# Altium footprint library 00.PcbLib: 150 footprints (part 7 of 10)
Each footprint in its own frame and in the unit in brackets; x right, y up, seen from the top. Pads: shape width x height; smd on the part's side, far side on the other; paste and mask are expansions set on the pad; w line width, h text height; cw(c..) or ccw(c..) is an arc to the next point about the centre after c.
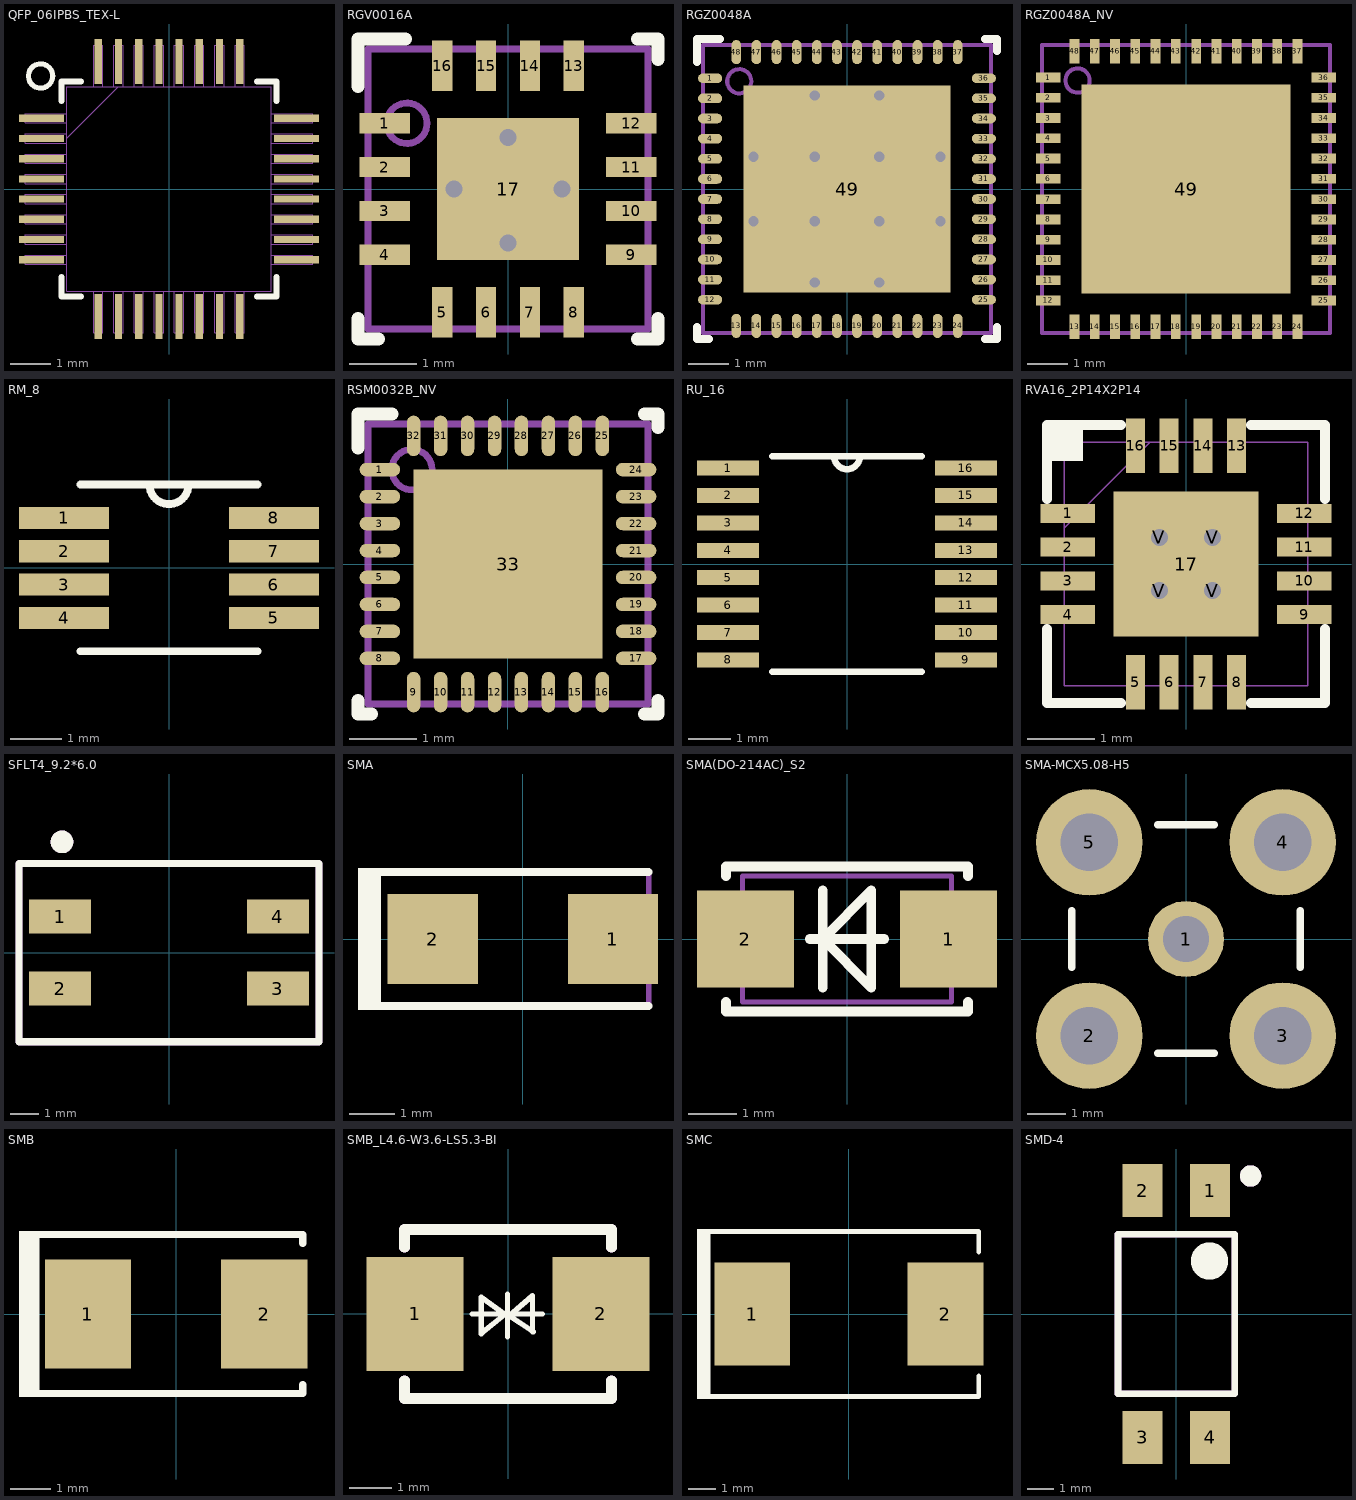
[diagram p6: the footprints below, top view; thin cyan lines are the x and y axes]

## QFP_06IPBS_TEX-L [mil]
pads (32):
  rect 44x7 smd paste+0 mask+0: 1(-124,68.92) 2(-124,49.23) 3(-124,29.54) 4(-124,9.85) 5(-124,-9.85) 6(-124,-29.54) 7(-124,-49.23) 8(-124,-68.92) 17(124,-68.92) 18(124,-49.23) 19(124,-29.54) 20(124,-9.85) 21(124,9.85) 22(124,29.54) 23(124,49.23) 24(124,68.92)
  rect 7x44 smd paste+0 mask+0: 9(-68.92,-124) 10(-49.23,-124) 11(-29.54,-124) 12(-9.85,-124) 13(9.85,-124) 14(29.54,-124) 15(49.23,-124) 16(68.92,-124) 25(68.92,124) 26(49.23,124) 27(29.54,124) 28(9.85,124) 29(-9.85,124) 30(-29.54,124) 31(-49.23,124) 32(-68.92,124)
Top Overlay:
  circle w5: c-125,110 r11.81
  lines w6: -104.5,-85.52 -104.5,-104.5 -85.52,-104.5 ; -104.5,85.52 -104.5,104.5 -85.52,104.5 ; 85.52,-104.5 104.5,-104.5 104.5,-85.52 ; 85.52,104.5 104.5,104.5 104.5,85.52
Top Component Outline (Mech100):
  lines w1: -99.5,49.5 -49.5,99.5 ; -140,-73.42 -99.5,-73.42 -99.5,-64.42 -140,-64.42 -140,-73.42 ; -140,-53.73 -99.5,-53.73 -99.5,-44.73 -140,-44.73 -140,-53.73 ; -140,-34.03 -99.5,-34.03 -99.5,-25.04 -140,-25.04 -140,-34.03 ; -140,-14.35 -99.5,-14.35 -99.5,-5.34 -140,-5.34 -140,-14.35 ; -140,5.34 -99.5,5.34 -99.5,14.35 -140,14.35 -140,5.34 ; -140,25.04 -99.5,25.04 -99.5,34.03 -140,34.03 -140,25.04 ; -140,44.73 -99.5,44.73 -99.5,53.73 -140,53.73 -140,44.73 ; -140,64.42 -99.5,64.42 -99.5,73.42 -140,73.42 -140,64.42 ; -99.5,-99.5 -99.5,99.5 99.5,99.5 99.5,-99.5 -99.5,-99.5 ; -73.42,-140 -64.42,-140 -64.42,-99.5 -73.42,-99.5 -73.42,-140 ; -73.42,99.5 -73.42,140 -64.42,140 -64.42,99.5 -73.42,99.5 ; -53.73,-140 -44.73,-140 -44.73,-99.5 -53.73,-99.5 -53.73,-140 ; -53.73,99.5 -53.73,140 -44.73,140 -44.73,99.5 -53.73,99.5 ; -34.03,-140 -25.04,-140 -25.04,-99.5 -34.03,-99.5 -34.03,-140 ; -34.03,99.5 -34.03,140 -25.04,140 -25.04,99.5 -34.03,99.5 ; -14.35,-140 -5.34,-140 -5.34,-99.5 -14.35,-99.5 -14.35,-140 ; -14.35,99.5 -14.35,140 -5.34,140 -5.34,99.5 -14.35,99.5 ; 5.34,-140 14.35,-140 14.35,-99.5 5.34,-99.5 5.34,-140 ; 5.34,99.5 5.34,140 14.35,140 14.35,99.5 5.34,99.5 ; 25.04,-140 34.03,-140 34.03,-99.5 25.04,-99.5 25.04,-140 ; 25.04,99.5 25.04,140 34.03,140 34.03,99.5 25.04,99.5 ; 44.73,-140 53.73,-140 53.73,-99.5 44.73,-99.5 44.73,-140 ; 44.73,99.5 44.73,140 53.73,140 53.73,99.5 44.73,99.5 ; 64.42,-140 73.42,-140 73.42,-99.5 64.42,-99.5 64.42,-140 ; 64.42,99.5 64.42,140 73.42,140 73.42,99.5 64.42,99.5 ; 99.5,-73.42 140,-73.42 140,-64.42 99.5,-64.42 99.5,-73.42 ; 99.5,-53.73 140,-53.73 140,-44.73 99.5,-44.73 99.5,-53.73 ; 99.5,-34.03 140,-34.03 140,-25.04 99.5,-25.04 99.5,-34.03 ; 99.5,-14.35 140,-14.35 140,-5.34 99.5,-5.34 99.5,-14.35 ; 99.5,5.34 140,5.34 140,14.35 99.5,14.35 99.5,5.34 ; 99.5,25.04 140,25.04 140,34.03 99.5,34.03 99.5,25.04 ; 99.5,44.73 140,44.73 140,53.73 99.5,53.73 99.5,44.73 ; 99.5,64.42 140,64.42 140,73.42 99.5,73.42 99.5,64.42
3D body "QFP_06IPBS_TEX.step": height 47.09, standoff 0, extent -139.99,-139.99 140.01,140.01

## RGV0016A [mm]
pads (17):
  rect 0.75x0.3 smd paste+0 mask+0.051: 1(-1.825,0.975) 2(-1.825,0.325) 3(-1.825,-0.325) 4(-1.825,-0.975) 9(1.825,-0.975) 10(1.825,-0.325) 11(1.825,0.325) 12(1.825,0.975)
  rect 0.3x0.75 smd paste+0 mask+0.051: 5(-0.975,-1.825) 6(-0.325,-1.825) 7(0.325,-1.825) 8(0.975,-1.825) 13(0.975,1.825) 14(0.325,1.825) 15(-0.325,1.825) 16(-0.975,1.825)
  rect 2.1x2.1 smd paste-1.037 mask+0.051: 17(0,0)
via -0.8,0 diameter 0.5 hole 0.254
via 0,-0.8 diameter 0.5 hole 0.254
via 0.8,0 diameter 0.5 hole 0.254
via 0,0.762 diameter 0.5 hole 0.254
Top Overlay:
  lines w0.2: -2.225,-1.925 -2.225,-2.225 -1.925,-2.225 ; -2.225,1.525 -2.225,2.225 -1.525,2.225 ; 1.925,-2.225 2.225,-2.225 2.225,-1.925 ; 1.925,2.225 2.225,2.225 2.225,1.925
Top Component Outline (Mech100):
  circle w0.1: c-1.5,0.975 r0.3
  lines w0.1: -2.075,-2.075 -2.075,2.075 2.075,2.075 2.075,-2.075 -2.075,-2.075
3D body: height 1, standoff 0, extent -2.032,-2.032 2.032,2.032

## RGZ0048A [mm] "QFN, 48-Leads, Body 7x7mm, Pitch 0.5mm, Thermal Pad 5.15X5.15mm, TI recommended"
height 1
pads (49):
  oval 0.6x0.24 smd: 1(-3.4,2.75) 2(-3.4,2.25) 3(-3.4,1.75) 4(-3.4,1.25) 5(-3.4,0.75) 6(-3.4,0.25) 7(-3.4,-0.25) 8(-3.4,-0.75) 9(-3.4,-1.25) 10(-3.4,-1.75) 11(-3.4,-2.25) 12(-3.4,-2.75) 25(3.4,-2.75) 26(3.4,-2.25) 27(3.4,-1.75) 28(3.4,-1.25) 29(3.4,-0.75) 30(3.4,-0.25) 31(3.4,0.25) 32(3.4,0.75) 33(3.4,1.25) 34(3.4,1.75) 35(3.4,2.25) 36(3.4,2.75)
  oval 0.24x0.6 smd: 13(-2.75,-3.4) 14(-2.25,-3.4) 15(-1.75,-3.4) 16(-1.25,-3.4) 17(-0.75,-3.4) 18(-0.25,-3.4) 19(0.25,-3.4) 20(0.75,-3.4) 21(1.25,-3.4) 22(1.75,-3.4) 23(2.25,-3.4) 24(2.75,-3.4) 37(2.75,3.4) 38(2.25,3.4) 39(1.75,3.4) 40(1.25,3.4) 41(0.75,3.4) 42(0.25,3.4) 43(-0.25,3.4) 44(-0.75,3.4) 45(-1.25,3.4) 46(-1.75,3.4) 47(-2.25,3.4) 48(-2.75,3.4)
  rect 5.15x5.15 smd paste-2.6: 49(0,0)
via 0.804,-2.325 diameter 0.5 hole 0.254
via -0.804,-2.325 diameter 0.5 hole 0.254
via 2.325,-0.804 diameter 0.5 hole 0.254
via 0.804,-0.804 diameter 0.5 hole 0.254
via -0.804,-0.804 diameter 0.5 hole 0.254
via -2.325,-0.804 diameter 0.5 hole 0.254
via 2.325,0.804 diameter 0.5 hole 0.254
via 0.804,0.804 diameter 0.5 hole 0.254
via -0.804,0.804 diameter 0.5 hole 0.254
via -2.325,0.804 diameter 0.5 hole 0.254
via 0.804,2.325 diameter 0.5 hole 0.254
via -0.804,2.325 diameter 0.5 hole 0.254
Top Overlay:
  lines w0.2: -3.725,-3.425 -3.725,-3.725 -3.425,-3.725 ; -3.725,3.15 -3.725,3.725 -3.15,3.725 ; 3.425,-3.725 3.725,-3.725 3.725,-3.425 ; 3.425,3.725 3.725,3.725 3.725,3.425
Top Paste:
  region: -0.903,-0.903 -2.31,-0.903 -2.31,-2.31 -0.903,-2.31
  rectangle: 0.903,-2.31 2.31,-0.903
  rectangle: -0.703,-2.31 0.704,-0.903
  rectangle: -0.703,0.903 0.704,2.31
  rectangle: 0.903,0.903 2.31,2.31
  region: -0.903,2.31 -2.31,2.31 -2.31,0.903 -0.903,0.903
  region: -0.903,0.704 -2.31,0.704 -2.31,-0.703 -0.903,-0.703
  rectangle: 0.903,-0.703 2.31,0.704
  rectangle: -0.703,-0.703 0.704,0.704
Top Component Outline (Mech100):
  circle w0.1: c-2.675,2.675 r0.3
  lines w0.1: -3.575,-3.575 3.575,-3.575 3.575,3.575 -3.575,3.575 -3.575,-3.575
3D body: height 1.01, standoff 0.5, extent -2.974,2.376 -2.376,2.974
3D body: height 1, standoff 0, extent -3.575,-3.575 3.575,3.575

## RGZ0048A_NV [mm]
pads (49):
  rect 0.6x0.24 smd paste+0 mask+0.051: 1(-3.4,2.75) 2(-3.4,2.25) 3(-3.4,1.75) 4(-3.4,1.25) 5(-3.4,0.75) 6(-3.4,0.25) 7(-3.4,-0.25) 8(-3.4,-0.75) 9(-3.4,-1.25) 10(-3.4,-1.75) 11(-3.4,-2.25) 12(-3.4,-2.75) 25(3.4,-2.75) 26(3.4,-2.25) 27(3.4,-1.75) 28(3.4,-1.25) 29(3.4,-0.75) 30(3.4,-0.25) 31(3.4,0.25) 32(3.4,0.75) 33(3.4,1.25) 34(3.4,1.75) 35(3.4,2.25) 36(3.4,2.75)
  rect 0.24x0.6 smd paste+0 mask+0.051: 13(-2.75,-3.4) 14(-2.25,-3.4) 15(-1.75,-3.4) 16(-1.25,-3.4) 17(-0.75,-3.4) 18(-0.25,-3.4) 19(0.25,-3.4) 20(0.75,-3.4) 21(1.25,-3.4) 22(1.75,-3.4) 23(2.25,-3.4) 24(2.75,-3.4) 37(2.75,3.4) 38(2.25,3.4) 39(1.75,3.4) 40(1.25,3.4) 41(0.75,3.4) 42(0.25,3.4) 43(-0.25,3.4) 44(-0.75,3.4) 45(-1.25,3.4) 46(-1.75,3.4) 47(-2.25,3.4) 48(-2.75,3.4)
  rect 5.15x5.15 smd paste-2.562 mask+0.051: 49(0,0)
Top Paste:
  region: 0.15,0.1 0.1,0.15 0.1,1.11 0.15,1.16 1.11,1.16 1.16,1.11 1.16,0.15 1.11,0.1
  region: 1.41,0.1 1.36,0.15 1.36,1.11 1.41,1.16 2.37,1.16 2.42,1.11 2.42,0.15 2.37,0.1
  region: 1.41,1.36 1.36,1.41 1.36,2.37 1.41,2.42 2.37,2.42 2.42,2.37 2.42,1.41 2.37,1.36
  region: 0.15,1.36 0.1,1.41 0.1,2.37 0.15,2.42 1.11,2.42 1.16,2.37 1.16,1.41 1.11,1.36
  region: -0.15,-1.36 -0.1,-1.41 -0.1,-2.37 -0.15,-2.42 -1.11,-2.42 -1.16,-2.37 -1.16,-1.41 -1.11,-1.36
  region: -1.41,-1.36 -1.36,-1.41 -1.36,-2.37 -1.41,-2.42 -2.37,-2.42 -2.42,-2.37 -2.42,-1.41 -2.37,-1.36
  region: -1.41,-0.1 -1.36,-0.15 -1.36,-1.11 -1.41,-1.16 -2.37,-1.16 -2.42,-1.11 -2.42,-0.15 -2.37,-0.1
  region: -0.15,-0.1 -0.1,-0.15 -0.1,-1.11 -0.15,-1.16 -1.11,-1.16 -1.16,-1.11 -1.16,-0.15 -1.11,-0.1
  region: 0.15,-1.36 0.1,-1.41 0.1,-2.37 0.15,-2.42 1.11,-2.42 1.16,-2.37 1.16,-1.41 1.11,-1.36
  region: 1.41,-1.36 1.36,-1.41 1.36,-2.37 1.41,-2.42 2.37,-2.42 2.42,-2.37 2.42,-1.41 2.37,-1.36
  region: 1.41,-0.1 1.36,-0.15 1.36,-1.11 1.41,-1.16 2.37,-1.16 2.42,-1.11 2.42,-0.15 2.37,-0.1
  region: 0.15,-0.1 0.1,-0.15 0.1,-1.11 0.15,-1.16 1.11,-1.16 1.16,-1.11 1.16,-0.15 1.11,-0.1
  region: -0.15,1.36 -0.1,1.41 -0.1,2.37 -0.15,2.42 -1.11,2.42 -1.16,2.37 -1.16,1.41 -1.11,1.36
  region: -1.41,1.36 -1.36,1.41 -1.36,2.37 -1.41,2.42 -2.37,2.42 -2.42,2.37 -2.42,1.41 -2.37,1.36
  region: -1.41,0.1 -1.36,0.15 -1.36,1.11 -1.41,1.16 -2.37,1.16 -2.42,1.11 -2.42,0.15 -2.37,0.1
  region: -0.15,0.1 -0.1,0.15 -0.1,1.11 -0.15,1.16 -1.11,1.16 -1.16,1.11 -1.16,0.15 -1.11,0.1
Top Component Outline (Mech100):
  circle w0.1: c-2.675,2.675 r0.3
  lines w0.1: -3.55,-3.55 -3.55,3.55 3.55,3.55 3.55,-3.55 -3.55,-3.55

## RM_8 [mm]
pads (8):
  rect 1.761x0.431 smd: 1(-2.05,0.975) 2(-2.05,0.325) 3(-2.05,-0.325) 4(-2.05,-0.975) 5(2.05,-0.975) 6(2.05,-0.325) 7(2.05,0.325) 8(2.05,0.975)
Top Overlay:
  lines w0.152: -1.727,-1.627 1.727,-1.627 ; -1.727,1.627 1.727,1.627 ; -0.381,1.627 ccw(c0,1.627) 0.381,1.627
Top 3D Body:
  lines w0: -0.305,1.5 ccw(c0,1.5) 0.305,1.5
3D body "RM_8.stp": height 1.1, standoff 0, extent -2.575,-1.5 2.575,1.5

## RSM0032B_NV [mm]
pads (33):
  oval 0.6x0.2 smd paste+0 mask+0.051: 1(-1.9,1.4) 2(-1.9,1) 3(-1.9,0.6) 4(-1.9,0.2) 5(-1.9,-0.2) 6(-1.9,-0.6) 7(-1.9,-1) 8(-1.9,-1.4) 17(1.9,-1.4) 18(1.9,-1) 19(1.9,-0.6) 20(1.9,-0.2) 21(1.9,0.2) 22(1.9,0.6) 23(1.9,1) 24(1.9,1.4)
  oval 0.2x0.6 smd paste+0 mask+0.051: 9(-1.4,-1.9) 10(-1,-1.9) 11(-0.6,-1.9) 12(-0.2,-1.9) 13(0.2,-1.9) 14(0.6,-1.9) 15(1,-1.9) 16(1.4,-1.9) 25(1.4,1.9) 26(1,1.9) 27(0.6,1.9) 28(0.2,1.9) 29(-0.2,1.9) 30(-0.6,1.9) 31(-1,1.9) 32(-1.4,1.9)
  rect 2.8x2.8 smd paste-1.387 mask+0.051: 33(0,0)
Top Overlay:
  lines w0.2: -2.225,-2.025 -2.225,-2.225 -2.025,-2.225 ; -2.225,1.725 -2.225,2.225 -1.725,2.225 ; 2.025,-2.225 2.225,-2.225 2.225,-2.025 ; 2.025,2.225 2.225,2.225 2.225,2.025
Top Paste:
  region: -1.329,0.1 -0.1,0.1 -0.1,1.329 -1.329,1.329
  region: 0.1,0.1 1.329,0.1 1.329,1.329 0.1,1.329
  region: -1.329,-1.329 -0.1,-1.329 -0.1,-0.1 -1.329,-0.1
  region: 0.1,-1.329 1.329,-1.329 1.329,-0.1 0.1,-0.1
Top Component Outline (Mech100):
  circle w0.1: c-1.425,1.4 r0.3
  lines w0.1: -2.075,-2.075 -2.075,2.075 2.075,2.075 2.075,-2.075 -2.075,-2.075
3D body: height 0.25, standoff 0, extent -2.032,-2.032 2.032,2.032

## RU_16 [mil]
pads (16):
  rect 58x14 smd: 1(-111,89.57) 2(-111,63.98) 3(-111,38.39) 4(-111,12.8) 5(-111,-12.8) 6(-111,-38.39) 7(-111,-63.98) 8(-111,-89.57) 9(111,-89.57) 10(111,-63.98) 11(111,-38.39) 12(111,-12.8) 13(111,12.8) 14(111,38.39) 15(111,63.98) 16(111,89.57)
Top Overlay:
  lines w6: -69.61,-100.5 69.61,-100.5 ; -69.61,100.5 69.61,100.5 ; -12,100.5 ccw(c0,100.5) 12,100.5
Top 3D Body:
  lines w0: -12,100.5 ccw(c0,100.5) 12,100.5
3D body "RU_16.stp": height 47.1, standoff 0, extent -126,-100.5 126,100.5

## RVA16_2P14X2P14 [mm]
pads (21):
  rect 0.8x0.28 smd paste-0.14: 1(-1.75,0.75) 2(-1.75,0.25) 3(-1.75,-0.25) 4(-1.75,-0.75) 9(1.75,-0.75) 10(1.75,-0.25) 11(1.75,0.25) 12(1.75,0.75)
  rect 0.28x0.8 smd paste-0.14: 5(-0.75,-1.75) 6(-0.25,-1.75) 7(0.25,-1.75) 8(0.75,-1.75) 13(0.75,1.75) 14(0.25,1.75) 15(-0.25,1.75) 16(-0.75,1.75)
  rect 2.14x2.14 smd paste-1.057 mask-1.054: 17(0,0)
  round 0.508 hole 0.254: V(-0.394,-0.394) V(-0.394,0.394) V(0.394,-0.394) V(0.394,0.394)
Top Overlay:
  rectangle: -2.057,1.524 -1.524,2.057
  lines w0.152: -2.057,-0.966 -2.057,-2.057 -0.966,-2.057 ; -2.057,0.966 -2.057,2.057 -0.966,2.057 ; 0.966,-2.057 2.057,-2.057 2.057,-0.966 ; 0.966,2.057 2.057,2.057 2.057,0.966
Top Paste:
  region: 0.995,-0.494 0.635,-0.494 0.494,-0.635 0.494,-0.995 0.995,-0.995
  region: 0.995,0.294 0.635,0.294 0.494,0.152 0.494,-0.152 0.635,-0.294 0.995,-0.294
  region: 0.995,0.995 0.494,0.995 0.494,0.635 0.635,0.494 0.995,0.494
  region: 0.152,-0.494 -0.152,-0.494 -0.294,-0.635 -0.294,-0.995 0.294,-0.995 0.294,-0.635
  region: 0.152,0.294 -0.152,0.294 -0.294,0.152 -0.294,-0.152 -0.152,-0.294 0.152,-0.294 0.294,-0.152 0.294,0.152
  region: 0.294,0.995 -0.294,0.995 -0.294,0.635 -0.152,0.494 0.152,0.494 0.294,0.635
  region: -0.635,-0.494 -0.995,-0.494 -0.995,-0.995 -0.494,-0.995 -0.494,-0.635
  region: -0.635,0.294 -0.995,0.294 -0.995,-0.294 -0.635,-0.294 -0.494,-0.152 -0.494,0.152
  region: -0.494,0.995 -0.995,0.995 -0.995,0.494 -0.635,0.494 -0.494,0.635
  region: -0.635,2.125 -0.865,2.125 -0.865,1.375 -0.635,1.375
  region: -0.135,2.125 -0.365,2.125 -0.365,1.375 -0.135,1.375
  region: 0.365,2.125 0.135,2.125 0.135,1.375 0.365,1.375
  region: 0.865,2.125 0.635,2.125 0.635,1.375 0.865,1.375
  region: 2.125,0.865 1.375,0.865 1.375,0.635 2.125,0.635
  region: 2.125,0.365 1.375,0.365 1.375,0.135 2.125,0.135
  region: 2.125,-0.135 1.375,-0.135 1.375,-0.365 2.125,-0.365
  region: 2.125,-0.635 1.375,-0.635 1.375,-0.865 2.125,-0.865
  region: 0.865,-1.375 0.635,-1.375 0.635,-2.125 0.865,-2.125
  region: 0.365,-1.375 0.135,-1.375 0.135,-2.125 0.365,-2.125
  region: -0.135,-1.375 -0.365,-1.375 -0.365,-2.125 -0.135,-2.125
  region: -0.635,-1.375 -0.865,-1.375 -0.865,-2.125 -0.635,-2.125
  region: -1.375,-0.635 -2.125,-0.635 -2.125,-0.865 -1.375,-0.865
  region: -1.375,-0.135 -2.125,-0.135 -2.125,-0.365 -1.375,-0.365
  region: -1.375,0.365 -2.125,0.365 -2.125,0.135 -1.375,0.135
  region: -1.375,0.865 -2.125,0.865 -2.125,0.635 -1.375,0.635
Top Solder:
  region: 0.594,-1.134 0.594,1.134 1.134,1.134 1.134,-1.134
  region: 0.194,-1.134 0.194,1.134 -0.194,1.134 -0.194,-1.134
  region: -1.134,-1.134 -1.134,1.134 -0.594,1.134 -0.594,-1.134
  region: -1.134,-1.134 -1.134,-0.594 1.134,-0.594 1.134,-1.134
  region: -1.134,-0.194 -1.134,0.194 1.134,0.194 1.134,-0.194
  region: -1.134,0.594 -1.134,1.134 1.134,1.134 1.134,0.594
  region: -0.54,2.22 -0.96,2.22 -0.96,1.28 -0.54,1.28
  region: -0.04,2.22 -0.46,2.22 -0.46,1.28 -0.04,1.28
  region: 0.46,2.22 0.04,2.22 0.04,1.28 0.46,1.28
  region: 0.96,2.22 0.54,2.22 0.54,1.28 0.96,1.28
  region: 2.22,0.96 1.28,0.96 1.28,0.54 2.22,0.54
  region: 2.22,0.46 1.28,0.46 1.28,0.04 2.22,0.04
  region: 2.22,-0.04 1.28,-0.04 1.28,-0.46 2.22,-0.46
  region: 2.22,-0.54 1.28,-0.54 1.28,-0.96 2.22,-0.96
  region: 0.96,-1.28 0.54,-1.28 0.54,-2.22 0.96,-2.22
  region: 0.46,-1.28 0.04,-1.28 0.04,-2.22 0.46,-2.22
  region: -0.04,-1.28 -0.46,-1.28 -0.46,-2.22 -0.04,-2.22
  region: -0.54,-1.28 -0.96,-1.28 -0.96,-2.22 -0.54,-2.22
  region: -1.28,-0.54 -2.22,-0.54 -2.22,-0.96 -1.28,-0.96
  region: -1.28,-0.04 -2.22,-0.04 -2.22,-0.46 -1.28,-0.46
  region: -1.28,0.46 -2.22,0.46 -2.22,0.04 -1.28,0.04
  region: -1.28,0.96 -2.22,0.96 -2.22,0.54 -1.28,0.54
Top 3D Body:
  lines w0.025: -1.803,0.533 -0.533,1.803 ; -1.803,-1.803 -1.803,1.803 1.803,1.803 1.803,-1.803 -1.803,-1.803 ; -1.803,-0.902 -1.803,-0.598 -1.803,-0.902 ; -1.803,-0.402 -1.803,-0.098 -1.803,-0.402 ; -1.803,0.098 -1.803,0.402 -1.803,0.098 ; -1.803,0.598 -1.803,0.902 -1.803,0.598 ; -0.902,-1.803 -0.598,-1.803 -0.902,-1.803 ; -0.902,1.803 -0.598,1.803 -0.902,1.803 ; -0.402,-1.803 -0.098,-1.803 -0.402,-1.803 ; -0.402,1.803 -0.098,1.803 -0.402,1.803 ; 0.098,-1.803 0.402,-1.803 0.098,-1.803 ; 0.098,1.803 0.402,1.803 0.098,1.803 ; 0.598,-1.803 0.902,-1.803 0.598,-1.803 ; 0.598,1.803 0.902,1.803 0.598,1.803 ; 1.803,-0.902 1.803,-0.598 1.803,-0.902 ; 1.803,-0.402 1.803,-0.098 1.803,-0.402 ; 1.803,0.098 1.803,0.402 1.803,0.098 ; 1.803,0.598 1.803,0.902 1.803,0.598
3D body "RVA16_2P14X2P14.step": height 1.4, standoff 0, extent -1.854,-1.854 1.854,1.854

## SFLT4_9.2*6.0 [mm]
pads (4):
  rect 2.2x1.2 smd: 1(-3.85,1.27) 2(-3.85,-1.27) 3(3.85,-1.27) 4(3.85,1.27)
Top Overlay:
  circle w0.4: c-3.781,3.912 r0.2
  lines w0.254: -5.3,-3.15 5.3,-3.15 5.3,3.15 -5.3,3.15 -5.3,-3.15
Top Component Outline (Mech100):
  circle w0.4: c-3.781,3.912 r0.2
  lines w0.254: -5.3,-3.15 -5.3,3.15 5.3,3.15 5.3,-3.15 -5.3,-3.15
3D body: height 5, standoff 0, extent -5.334,-3.175 5.334,3.175

## SMA [mm]
pads (2):
  rect 2x2 smd: 1(2,0) 2(-2,0)
Top Overlay:
  rectangle: -3.658,-1.575 -3.15,1.575
  lines w0.178: -3.327,-1.486 2.794,-1.486 ; -3.327,1.486 2.794,1.486
Top Component Outline (Mech100):
  rectangle: -3.658,-1.575 -3.15,1.575
  lines w0.127: -3.327,-1.486 2.794,-1.486 2.794,1.486 -3.327,1.486
3D body "SMA_nominal.stp": height 2.42, standoff 0.02, extent -2.6,-1.3 2.6,1.3

## SMA(DO-214AC)_S2 [mm]
height 1.1
pads (2):
  rect 2x2 smd: 1(2.1,0) 2(-2.1,0)
Top Overlay:
  lines w0.203: -2.5,-1.3 -2.5,-1.5 2.5,-1.5 2.5,-1.3 ; -2.5,1.3 -2.5,1.5 2.5,1.5 2.5,1.3 ; -0.77,0 0.77,0 ; -0.5,-1 -0.5,1 ; -0.5,0 0.5,1 0.5,-1 -0.5,0
Top 3D Body:
  lines w0.1: -2.16,-1.3 -2.16,1.3 2.16,1.3 2.16,-1.3 -2.16,-1.3
3D body "SMA_nominal.stp": height 2.42, standoff 0.02, extent -2.6,-1.3 2.6,1.3

## SMA-MCX5.08-H5 [mm]
pads (5):
  round 2 hole 1.2: 1(0,0)
  round 2.8 hole 1.5: 2(-2.54,-2.54) 3(2.54,-2.54) 4(2.54,2.54) 5(-2.54,2.54)
Top Overlay:
  lines w0.2: -3,-0.74 -3,0.74 ; -0.74,-3 0.74,-3 ; -0.74,3 0.74,3 ; 3,-0.74 3,0.74
3D body "c-5-1814832-2-c-3d.stp": height 9.5, standoff -4, extent -3.2,-3.2 3.2,3.2

## SMB [mm]
pads (2):
  rect 2.159x2.743 smd: 1(-2.21,0) 2(2.21,0)
Top Overlay:
  rectangle: -3.937,-2.083 -3.429,2.083
  lines w0.178: -3.607,-1.994 3.175,-1.994 3.175,-1.765 ; -3.607,1.994 3.175,1.994 3.175,1.765
3D body "SMB_nominal.stp": height 2.32, standoff 0.02, extent -2.7,-1.8 2.7,1.8

## SMB_L4.6-W3.6-LS5.3-BI [mm]
pads (2):
  rect 2.3x2.7 smd: 1(-2.2,0) 2(2.2,0)
Top Overlay:
  lines w0.127: -0.85,0 0.81,0 ; -0.64,-0.47 -0.077,-0.01 -0.63,0.4 -0.63,-0.47 ; -0.011,-0.546 -0.011,0.47 ; 0.58,-0.42 0.58,0.43 0.028,-0.04 0.6,-0.42
  lines w0.254: -2.45,-1.581 -2.45,-2 2.45,-2 2.45,-1.581 ; -2.45,1.581 -2.45,2 2.45,2 2.45,1.581
Top Component Outline (Mech100):
  lines w0.254: -2.45,-1.581 -2.45,-2 2.45,-2 2.45,-1.581 ; -2.45,1.581 -2.45,2 2.45,2 2.45,1.581
3D body: height 2, standoff 0, extent -2.413,-2.032 2.413,2.032

## SMC [mil]
pads (2):
  rect 110x150 smd: 1(-140.49,0) 2(140.49,0)
Top Overlay:
  rectangle: -221,-123.5 -201,123.5
  lines w7: -210,-120 189,-120 189,-90.25 ; -210,120 189,120 189,90.25
3D body "SMC_nominal.stp": height 91.25, standoff 0.6, extent -156.49,-116.13 156.5,116.15

## SMD-4 [mm]
pads (4):
  rect 1.5x2 smd: 1(1.27,4.65) 2(-1.27,4.65) 3(-1.27,-4.65) 4(1.27,-4.65)
Top Overlay:
  lines w0.254: -2.2,-3 -2.2,3 2.2,3 2.2,-3 -2.2,-3
  lines w0.4: 3,5.197 cw(c2.8,5.198) 3,5.199
  lines w0.7: 1.6,1.994 cw(c1.25,1.996) 1.6,1.999
Top Component Outline (Mech100):
  lines w0.254: -2.2,-3 2.2,-3 2.2,3 -2.2,3 -2.2,-3
  lines w0.4: 3,5.197 cw(c2.8,5.198) 3,5.199
3D body: height 3.5, standoff 0, extent -2.286,-3.048 2.286,3.048